# Altium schematic symbol library Electronic Devices_LIB.SchLib: 703 symbols (part 1 of 8) (continued)
## CAP_4.7UF_16V_X5R_0603 (continued)
CAP CER 4.7UF 16V X5R 0603; Manufacturer: Samsung; Material: Ceramic; Tolerance: 10%; Supplier 1: Digi-Key; Manufacturer Part Number: CL10A475KO8NNNC; RoHS: Yes; Category: Ceramic Capacitors; Stock 1: 1197540; Pricing 1: 1=0.12, 10=0.084, 50=0.0476, 100=0.0394, 500=0.02764, 1000=0.02288 (USD); Mount: Surface Mount; Case Code (Metric): 1608; Case Code (Imperial): 0603; Min Operating Temperature: -55°C; Max Operating Temperature: 85°C; Packaging: Tape and Reel; Voltage Rating: 16V; Dielectric: X5R; Series: CL; Construction: Flat; Length: 1.6mm; Height: 0.8mm; Depth: 0.8mm; Radiation Hardening: No; RoHS Compliant: Yes; ComponentLink1URL: https://datasheet.ciiva.com/25795/cl10a475ko8nnnc-25795890.pdf?src-supplier=Digi-Key; ComponentLink1Description: https://datasheet.ciiva.com/25795/cl10a475ko8nnnc-25795890.pdf?src-supplier=Digi-Key; ComponentLink2URL: https://datasheet.ciiva.com/26838/getdatasheetpartid-358619-26838383.pdf?src-supplier=Verical; ComponentLink2Description: https://datasheet.ciiva.com/26838/getdatasheetpartid-358619-26838383.pdf?src-supplier=Verical; ComponentLink3URL: https://datasheet.ciiva.com/29198/457663-da-01-en-vs-kondensator-0603-29198671.pdf?src-supplier=Conrad; ComponentLink3Description: https://datasheet.ciiva.com/29198/457663-da-01-en-vs-kondensator-0603-29198671.pdf?src-supplier=Conrad; Supplier Part Number 1: 1276-1784-1-ND
footprint CAP_0603_CAPC1608X08N (Chip Capacitor, 2-Leads, Body 1.60x0.80mm, IPC Medium Density)
pins: 1, 2

## CAP_4.7uF_16V_X7S_0603
designator C?, comment Capacitance: 4.7uF  Voltage Rating (DC): 16V  Case/Package: 0603  (hidden comment: GRM188C71C475KE21D)
Multilayer Ceramic Capacitor, 4.7 uF, 16 V, ± 10%, X7S, 0603 [1608 Metric]; Manufacturer: Murata; Material: 4241ConductorMaterial; Dielectric: 1542DielectricType; Supplier 1: Digikey; Manufacturer Part Number: GRM188C71C475KE21D; RoHS: Yes; Category: Ceramic Capacitors; Stock 1: 234182; Pricing 1: 1=0.27, 10=0.173, 50=0.1216, 100=0.0981, 500=0.07292, 1000=0.06381 (USD); Mount: Surface Mount; Min Operating Temperature: -55°C; Max Operating Temperature: 125°C; Series: GRM; Voltage Rating: 16V; Tolerance: 10%; Length: 1.6mm; Width: 800um; Height: 950um; Thickness: 800um; RoHS Compliant: Yes; ComponentLink1URL: http://search.murata.co.jp/Ceramy/image/img/A01X/G101/ENG/GRM188C71C475KE21-01.pdf?src-supplier=Digikey; ComponentLink1Description: http://search.murata.co.jp/Ceramy/image/img/A01X/G101/ENG/GRM188C71C475KE21-01.pdf?src-supplier=Digikey; Supplier Part Number 1: 490-16337-1-ND
footprint CAP_0603_CAPC1608X08N (Chip Capacitor, 2-Leads, Body 1.60x0.80mm, IPC Medium Density)
pins: 1, 2

## CAP_4.7uF_25V_X7R_0805
designator C?, comment Voltage Rating: 25V  Case/Package: 0805  Capacitance: 4.7uF  (hidden comment: CGA4J1X7R1E475M125AC)
Cap Ceramic 4.7uF 25V X7R 20% SMD 0805 125°C Blister Plastic T/R; Manufacturer: TDK; Supplier 1: Digikey; Manufacturer Part Number: CGA4J1X7R1E475M125AC; RoHS: Yes; Category: Ceramic Capacitors; Stock 1: 7894; Pricing 1: 1=0.43, 10=0.289, 50=0.2298, 100=0.1898, 500=0.14832, 1000=0.12607 (USD); Mount: Surface Mount; Case Code (Metric): 2012; Case Code (Imperial): 0805; Weight: 0.000194oz; Min Operating Temperature: -55°C; Max Operating Temperature: 125°C; Package Quantity: 2000; Packaging: Tape and Reel; Tolerance: 20%; Dielectric: X7R; Termination: SMD/SMT; Voltage Rating (DC): 25V; Series: CGA; Length: 2mm; Width: 1.25mm; Height: 1.25mm; Ratings: AEC-Q200; RoHS Compliant: Yes; ComponentLink1URL: https://product.tdk.com/info/en/documents/chara_sheet/CGA4J1X7R1E475M125AC.pdf?src-supplier=Digikey; ComponentLink1Description: https://product.tdk.com/info/en/documents/chara_sheet/CGA4J1X7R1E475M125AC.pdf?src-supplier=Digikey; ComponentLink2URL: http://product.tdk.com/en/catalog/datasheets/mlcc_automotive_general_en.pdf?src-supplier=Avnet; ComponentLink2Description: http://product.tdk.com/en/catalog/datasheets/mlcc_automotive_general_en.pdf?src-supplier=Avnet; ComponentLink3URL: http://product.tdk.com/capacitor/mlcc/detailed_information.php?lang=en&ref=jp&part_no=CGA4J1X7R1E475M125AC&src-supplier=Mouser; ComponentLink3Description: http://product.tdk.com/capacitor/mlcc/detailed_information.php?lang=en&ref=jp&part_no=CGA4J1X7R1E475M125AC&src-supplier=Mouser; ComponentLink4URL: https://datasheet.octopart.com/CGA4J1X7R1E475M125AC-TDK-datasheet-43366117.pdf?src-supplier=Future+Electronics; ComponentLink4Description: https://datasheet.octopart.com/CGA4J1X7R1E475M125AC-TDK-datasheet-43366117.pdf?src-supplier=Future+Electronics; ComponentLink5URL: https://datasheet.octopart.com/CGA4J1X7R1E475M125AC-TDK-datasheet-165583812.pdf?src-supplier=TME; ComponentLink5Description: https://datasheet.octopart.com/CGA4J1X7R1E475M125AC-TDK-datasheet-165583812.pdf?src-supplier=TME; Supplier Part Number 1: 445-12761-1-ND
footprint CAP_0805_CAPC2012X12N (Chip Capacitor, 2-Leads, Body 2.00x1.25mm, IPC Medium Density)
pins: 1, 2

## CAP_4.7uF_35V_X5R_1206
designator C?, comment Capacitance: 4.7uF  Voltage Rating: 35V  Case/Package: 1206  (hidden comment: CL31A475KL9LNNC)
Cap Ceramic 4.7uF 35V X5R 10% SMD 1206 85°C Cardboard T/R; Manufacturer: Samsung; Supplier 1: Mouser; Manufacturer Part Number: CL31A475KL9LNNC; RoHS: Yes; Category: Ceramic Capacitors; Stock 1: 1740; Pricing 1: 1=0.42, 10=0.227, 50=0.227, 100=0.147, 1000=0.125, 10000=0.099 (USD); Mount: Surface Mount; Case Code (Metric): 3216; Case Code (Imperial): 1206; Min Operating Temperature: -55°C; Max Operating Temperature: 85°C; Tolerance: 10%; Packaging: Tape and Reel; Dielectric: X5R; Series: CL; Construction: Flat; Length: 3.2mm; Height: 0.9mm; Depth: 1.6mm; Radiation Hardening: No; RoHS Compliant: Yes; ComponentLink1URL: https://datasheet.ciiva.com/25726/cl31a475kl9lnnc-25726083.pdf?src-supplier=Digi-Key; ComponentLink1Description: https://datasheet.ciiva.com/25726/cl31a475kl9lnnc-25726083.pdf?src-supplier=Digi-Key; ComponentLink2URL: https://datasheet.ciiva.com/15196/getdatasheetpartid-359588-15196005.pdf?src-supplier=Verical; ComponentLink2Description: https://datasheet.ciiva.com/15196/getdatasheetpartid-359588-15196005.pdf?src-supplier=Verical; Supplier Part Number 1: 187-CL31A475KL9LNNC
footprint CAP_1206_CAPC3216X16N (Chip Capacitor, 2-Leads, Body 3.20x1.60mm, IPC Medium Density)
pins: 1, 2

## CAP_4.7uF_50V_X7R_1210
designator C?, comment Capacitance: 4.7uF  Voltage Rating: 50V  Case Code (Imperial): 1210  (hidden comment: CC1210KKX7R9BB475)
Multilayer Ceramic Capacitor, 4.7 uF, 50 V, ± 10%, X7R, 1210 [3225 Metric]; Manufacturer: Yageo; Supplier 1: Digikey; Manufacturer Part Number: CC1210KKX7R9BB475; RoHS: Yes; Category: Ceramic Capacitors; Stock 1: 16965; Pricing 1: 1=0.44, 10=0.293, 50=0.2334, 100=0.1927 (USD); Mount: Surface Mount; Case/Package: 1210; Case Code (Metric): 3225; Weight: 0.000564oz; Min Operating Temperature: -55°C; Tolerance: 10%; Packaging: Tape and Reel; Dielectric: X7R; Voltage Rating (DC): 50V; Package Quantity: 500; Series: CC; Length: 0.126inch; Width: 0.098inch; Thickness: 0.11inch; Lead Free: Lead Free; Halogen Free: Halogen Free; RoHS Compliant: Yes; ComponentLink1URL: http://www.mouser.com/ds/2/447/Yageo_UPY-GP_NP0_16V-to-50V_9-358835.pdf?src-supplier=Mouser; ComponentLink1Description: http://www.mouser.com/ds/2/447/Yageo_UPY-GP_NP0_16V-to-50V_9-358835.pdf?src-supplier=Mouser; ComponentLink2URL: http://www.yageo.com/documents/recent/UPY-GPHC_X7R_6.3V-to-50V_18.pdf?src-supplier=Digikey; ComponentLink2Description: http://www.yageo.com/documents/recent/UPY-GPHC_X7R_6.3V-to-50V_18.pdf?src-supplier=Digikey; ComponentLink3URL: https://www.yageo.com/upload/media/product/productsearch/datasheet/mlcc/UPY-GPHC_X7R_6.3V-to-50V_18.pdf?src-supplier=Digikey; ComponentLink3Description: https://www.yageo.com/upload/media/product/productsearch/datasheet/mlcc/UPY-GPHC_X7R_6.3V-to-50V_18.pdf?src-supplier=Digikey; ComponentLink4URL: https://datasheet.octopart.com/CC1210KKX7R9BB475-Yageo-datasheet-151948686.pdf?src-supplier=Farnell; ComponentLink4Description: https://datasheet.octopart.com/CC1210KKX7R9BB475-Yageo-datasheet-151948686.pdf?src-supplier=Farnell; ComponentLink5URL: https://datasheet.octopart.com/CC1210KKX7R9BB475-Yageo-datasheet-137700084.pdf?src-supplier=Future+Electronics; ComponentLink5Description: https://datasheet.octopart.com/CC1210KKX7R9BB475-Yageo-datasheet-137700084.pdf?src-supplier=Future+Electronics; Supplier Part Number 1: 311-2037-1-ND; Max Operating Temperature: 125°C
footprint CAP_1210_CAPC3225X270N (0.126" L x 0.098" W (3.20mm x 2.50mm))
pins: 1, 2

## CAP_5.6pF_25V_NP0_0402
designator C?, comment 04023A5R6JAT2A  Capacitance: 5.6pF  Voltage Rating: 25V  Case/Package: 0402
Cap Ceramic 5.6pF 25V C0G 5% SMD 0402 125°C Paper T/R; Manufacturer: Kyocera AVX; Supplier 1: Mouser; Manufacturer Part Number: 04023A5R6JAT2A; RoHS: Yes; Category: Ceramic Capacitors; Stock 1: 3836; Pricing 1: 1=0.26, 10=0.173, 50=0.173, 100=0.098, 1000=0.061, 10000=0.047 (USD); Mount: Surface Mount; Number of Pins: 2; Case Code (Metric): 1005; Case Code (Imperial): 0402; Min Operating Temperature: -55°C; Max Operating Temperature: 125°C; Tolerance: 5%; Package Quantity: 10000; Packaging: Tape and Reel; Voltage Rating (DC): 25V; Dielectric: C0G; Termination: SMD/SMT; Series: -; Construction: Flat; Length: 1mm; Width: 0.02inch; Thickness: 0.022inch; Depth: 0.5mm; Radiation Hardening: No; RoHS Compliant: Yes; ComponentLink1URL: https://datasheet.ciiva.com/206/ccog-206404.pdf?src-supplier=Digi-Key; ComponentLink1Description: https://datasheet.ciiva.com/206/ccog-206404.pdf?src-supplier=Digi-Key; ComponentLink2URL: https://datasheet.ciiva.com/11570/ccog-11570453.pdf?src-supplier=Avnet; ComponentLink2Description: https://datasheet.ciiva.com/11570/ccog-11570453.pdf?src-supplier=Avnet; Supplier Part Number 1: 581-04023A5R6JAT2A
footprint CAP_0402_CAPC1005X05N (Chip Capacitor, 2-Leads, Body 1.00x0.50mm, IPC Medium Density)
pins: 1, 2

## CAP_5pF_50V_NP0_0603
designator C?, comment Voltage Rating: 50V  Capacitance: 5pF  Case/Package: 0603  (hidden comment: CL10C050CB81PNC)
Cap Cer 5PF 50V C0G/NP0 0603; Manufacturer: Samsung; Supplier 1: Digikey; Manufacturer Part Number: CL10C050CB81PNC; RoHS: Yes; Category: Ceramic Capacitors; Stock 1: 13452; Pricing 1: 1=0.1, 10=0.039, 50=0.0264, 100=0.0225, 500=0.01612, 1000=0.01413 (USD); Mount: Surface Mount; Case Code (Imperial): 0603; Case Code (Metric): 1608; Min Operating Temperature: -55°C; Max Operating Temperature: 125°C; Packaging: Cut Tape; Series: CL; Ratings: AEC-Q200; RoHS Compliant: Yes; ComponentLink1URL: http://www.samsungsem.com/kr/support/product-search/mlcc/CL10C050CB81PNC.jsp?src-supplier=Digikey; ComponentLink1Description: http://www.samsungsem.com/kr/support/product-search/mlcc/CL10C050CB81PNC.jsp?src-supplier=Digikey; Supplier Part Number 1: 1276-7005-1-ND
footprint CAP_0603_CAPC1608X08N (Chip Capacitor, 2-Leads, Body 1.60x0.80mm, IPC Medium Density)
pins: 1, 2

## CAP_6.8nF_50V_X7R_0603
designator C?, comment Voltage Rating: 50V  Capacitance: 6.8nF  Case/Package: 0603  (hidden comment: CL10B682JB8NNNC)
Multilayer Ceramic Capacitor, 6800 pF, 50 V, ± 5%, X7R, 0603 [1608 Metric]; Manufacturer: Samsung; Supplier 1: Digikey; Manufacturer Part Number: CL10B682JB8NNNC; RoHS: Yes; Category: Ceramic Capacitors; Stock 1: 170085; Pricing 1: 1=0.1, 10=0.019, 50=0.0108, 100=0.0083, 500=0.00626, 1000=0.00492 (USD); Mount: Surface Mount; Case Code (Metric): 1608; Case Code (Imperial): 0603; Material: Ceramic; Min Operating Temperature: -55°C; Max Operating Temperature: 125°C; Tolerance: 5%; Packaging: Tape and Reel; Package Quantity: 1; Dielectric: X7R; Voltage: 50V; Voltage Rating (DC): 50V; Series: CL; Construction: Flat; Length: 1.6mm; Width: 0.031inch; Height: 0.8mm; Thickness: 0.035inch; Depth: 0.8mm; Radiation Hardening: No; RoHS Compliant: Yes; ComponentLink1URL: https://datasheet.ciiva.com/25770/cl10b682jb8nnnc-25770152.pdf?src-supplier=Digikey; ComponentLink1Description: https://datasheet.ciiva.com/25770/cl10b682jb8nnnc-25770152.pdf?src-supplier=Digikey; ComponentLink2URL: https://datasheet.ciiva.com/26838/getdatasheetpartid-640154-26838477.pdf?src-supplier=Verical; ComponentLink2Description: https://datasheet.ciiva.com/26838/getdatasheetpartid-640154-26838477.pdf?src-supplier=Verical; Supplier Part Number 1: 1276-2099-1-ND
footprint CAP_0603_CAPC1608X08N (Chip Capacitor, 2-Leads, Body 1.60x0.80mm, IPC Medium Density)
pins: 1, 2

## CAP_6pF_50V_NP0_0402
designator C?, comment Capacitance: 6pF  Voltage Rating: 50V  Case/Package: 0402  (hidden comment: GRM1555C1H6R0DA01D)
Multilayer Ceramic Capacitor, 6 pF, 50 V, ± 0.5pF, C0G (NP0), 0402 [1005 Metric]; Manufacturer: Murata; Supplier 1: Digi-Key; Manufacturer Part Number: GRM1555C1H6R0DA01D; RoHS: Yes; Category: Ceramic Capacitors; Stock 1: 208302; Pricing 1: 1=0.1, 10=0.036, 50=0.0204, 100=0.0158, 500=0.0119, 1000=0.00935, 2500=0.0085, 5000=0.00782 (USD); Mount: Surface Mount; Case Code (Imperial): 0402; Case Code (Metric): 1005; Weight: 2.3E-05oz; Min Operating Temperature: -55°C; Max Operating Temperature: 125°C; Packaging: Tape and Reel; Package Quantity: 1; Voltage Rating (DC): 50V; Dielectric: C0G; Termination: SMD/SMT; Series: GRM; Construction: Flat; Length: 1mm; Width: 0.02inch; Height: 0.5mm; Thickness: 0.022inch; Depth: 0.5mm; Radiation Hardening: No; Lead Free: Lead Free; RoHS Compliant: Yes; ComponentLink1URL: https://datasheet.ciiva.com/16507/product-16507873.pdf?src-supplier=Future+Electronics; ComponentLink1Description: https://datasheet.ciiva.com/16507/product-16507873.pdf?src-supplier=Future+Electronics; ComponentLink2URL: https://datasheet.ciiva.com/6277/partnumbering-e-01-6277820.pdf?src-supplier=Digi-Key; ComponentLink2Description: https://datasheet.ciiva.com/6277/partnumbering-e-01-6277820.pdf?src-supplier=Digi-Key; ComponentLink3URL: https://datasheet.ciiva.com/6277/partnumbering-e-01-6277821.pdf?src-supplier=Digi-Key; ComponentLink3Description: https://datasheet.ciiva.com/6277/partnumbering-e-01-6277821.pdf?src-supplier=Digi-Key; ComponentLink4URL: https://datasheet.ciiva.com/6277/partnumbering-e-01-6277822.pdf?src-supplier=Digi-Key; ComponentLink4Description: https://datasheet.ciiva.com/6277/partnumbering-e-01-6277822.pdf?src-supplier=Digi-Key; Supplier Part Number 1: 490-5877-1-ND
footprint CAP_0402_CAPC1005X05N (Chip Capacitor, 2-Leads, Body 1.00x0.50mm, IPC Medium Density)
pins: 1, 2

## CAP_7PF_50V_NP0_0603
designator C?, comment Voltage Rating (DC): 50V  Capacitance: 7pF  Case/Package: 0603  (hidden comment: C1608C0G1H070D080AA)
C Series 0603 7 pF 50 V ±0.5 pF Tolerance C0G SMT Multilayer Ceramic Capacitor; Manufacturer: TDK; Supplier 1: Digi-Key; Manufacturer Part Number: C1608C0G1H070D080AA; RoHS: Yes; Category: Ceramic Capacitors; Stock 1: 64389; Pricing 1: 1=0.1, 10=0.073, 50=0.0414, 100=0.0343, 500=0.02402, 1000=0.01989 (USD); Mount: Surface Mount; Dielectric Material: Ceramic; Case Code (Metric): 1608; Case Code (Imperial): 0603; Weight: 7.1E-05oz; Min Operating Temperature: -55°C; Max Operating Temperature: 125°C; Construction: Flat; Packaging: Tape and Reel; Voltage Rating: 50V; Package Quantity: 4000; Dielectric: C0G; Termination: SMD/SMT; Series: C; Length: 1.6mm; Width: 0.8mm; Height: 0.8mm; Depth: 0.8mm; Lead Free: Lead Free; RoHS Compliant: Yes; Reach SVHC Compliant: No; ComponentLink1URL: https://datasheet.ciiva.com/24217/c1608c0g1h070d080aa-264569-24217366.pdf?src-supplier=Mouser; ComponentLink1Description: https://datasheet.ciiva.com/24217/c1608c0g1h070d080aa-264569-24217366.pdf?src-supplier=Mouser; ComponentLink2URL: https://datasheet.ciiva.com/16427/e413-c-16427733.pdf?src-supplier=Future+Electronics; ComponentLink2Description: https://datasheet.ciiva.com/16427/e413-c-16427733.pdf?src-supplier=Future+Electronics; ComponentLink3URL: https://datasheet.ciiva.com/6293/tdkmlcccaprange-6293212.pdf?src-supplier=Digi-Key; ComponentLink3Description: https://datasheet.ciiva.com/6293/tdkmlcccaprange-6293212.pdf?src-supplier=Digi-Key; ComponentLink4URL: https://datasheet.ciiva.com/6293/tdkmlcccaprange-6293215.pdf?src-supplier=Digi-Key; ComponentLink4Description: https://datasheet.ciiva.com/6293/tdkmlcccaprange-6293215.pdf?src-supplier=Digi-Key; Supplier Part Number 1: 445-5041-1-ND
footprint CAP_0603_CAPC1608X08N (Chip Capacitor, 2-Leads, Body 1.60x0.80mm, IPC Medium Density)
pins: 1, 2

## CAP_8pF_50V_NP0_0603
designator C?, comment GRM1885C1H8R0DA01D  Capacitance: 8pF  Voltage Rating: 50V  Case/Package: 0603
CAP CER 8PF 50V C0G/NP0 0603; Manufacturer: Murata; Material: Ceramic; Dielectric: C0G; Supplier 1: Digi-Key; Manufacturer Part Number: GRM1885C1H8R0DA01D; RoHS: Yes; Category: Ceramic Capacitors; Stock 1: 35490; Pricing 1: 1=0.11, 10=0.079, 50=0.045, 100=0.0372, 500=0.02608, 1000=0.0216 (USD); Mount: Surface Mount; Case Code (Metric): 1608; Min Operating Temperature: -55°C; Max Operating Temperature: 125°C; Package Quantity: 4000; Packaging: Tape and Reel; Voltage Rating (DC): 50V; Termination: SMD/SMT; Series: GRM; Length: 1.6mm; Width: 0.8mm; Height: 0.8mm; Thickness: 0.035inch; Lead Free: Lead Free; RoHS Compliant: Yes; ComponentLink1URL: https://datasheet.ciiva.com/29538/partnumbering-e-01-29538236.pdf?src-supplier=Digi-Key; ComponentLink1Description: https://datasheet.ciiva.com/29538/partnumbering-e-01-29538236.pdf?src-supplier=Digi-Key; ComponentLink2URL: https://datasheet.ciiva.com/41860/partnumbering-e-01-41860761.pdf?src-supplier=Digi-Key; ComponentLink2Description: https://datasheet.ciiva.com/41860/partnumbering-e-01-41860761.pdf?src-supplier=Digi-Key; Supplier Part Number 1: 490-9670-6-ND; Case Code (Imperial): 0603
footprint CAP_0603_CAPC1608X08N (Chip Capacitor, 2-Leads, Body 1.60x0.80mm, IPC Medium Density)
pins: 1, 2

## CAP_9PF_50V_NP0_0603
designator C?, comment Voltage Rating: 50V  Capacitance: 9pF  Case/Package: 0603  (hidden comment: GRM1885C1H9R0DA01D)
0603 9 pF 50 V ±0.5 pF Tolerance C0G/NP0 Multilayer Ceramic Capacitor; Manufacturer: Murata; Dielectric: C0G; Supplier 1: Digi-Key; Manufacturer Part Number: GRM1885C1H9R0DA01D; RoHS: Yes; Category: Ceramic Capacitors; Stock 1: 54353; Pricing 1: 1=0.11, 10=0.079, 50=0.045, 100=0.0372, 500=0.02608, 1000=0.0216 (USD); Mount: Surface Mount; Case Code (Metric): 1608; Case Code (Imperial): 0603; Min Operating Temperature: -55°C; Max Operating Temperature: 125°C; Voltage Rating (DC): 50V; Packaging: Tape and Reel; Package Quantity: 4000; Termination: SMD/SMT; Series: GRM; Length: 0.063inch; Width: 0.031inch; Height: 0.8mm; Thickness: 0.035inch; RoHS Compliant: Yes; ComponentLink1URL: https://datasheet.ciiva.com/29538/partnumbering-e-01-29538197.pdf?src-supplier=Digi-Key; ComponentLink1Description: https://datasheet.ciiva.com/29538/partnumbering-e-01-29538197.pdf?src-supplier=Digi-Key; Supplier Part Number 1: 490-11483-1-ND
footprint CAP_0603_CAPC1608X08N (Chip Capacitor, 2-Leads, Body 1.60x0.80mm, IPC Medium Density)
pins: 1, 2

## CAP_10nF_10V_X7R_0402
designator C?, comment Case Code (Imperial): 0402  Voltage Rating: 10V  Capacitance: 10nF  (hidden comment: C0402C103K8RACTU)
Ceramic Capacitor, Multilayer, Ceramic, 10V, 10% +Tol, 10% -Tol, X7R, 15% TC, 0.01uF, 0402; Manufacturer: KEMET; Dielectric Material: 4241ConductorMaterial; Dissipation Factor: 5%; Supplier 1: Digikey; Manufacturer Part Number: C0402C103K8RACTU; RoHS: Yes; Category: Ceramic Capacitors; Stock 1: 703450; Pricing 1: 1=0.1, 10=0.018, 50=0.0104, 100=0.008, 500=0.006, 1000=0.00472, 2500=0.00429, 5000=0.00395 (USD); Mount: Surface Mount; Case/Package: 0402; Number of Pins: 2NUMBER; Case Code (Metric): 1005; Material: 4241ConductorMaterial; Min Operating Temperature: -55°C; Max Operating Temperature: 125°C; Tolerance: 10%; Dielectric: X7R; Package Quantity: 10000; Packaging: Tape and Reel; Voltage Rating (DC): 10V; Termination: SMD/SMT; Series: SMD Comm X7R; Construction: Flat; Length: 1mm; Width: 0.5mm; Height: 0.5mm; Lead Pitch: 0.3mm; Thickness: 0.022inch; Depth: 0.5mm; Radiation Hardening: No; RoHS Compliant: Yes; Reach SVHC Compliant: No; ComponentLink1URL: http://www.jameco.com/Jameco/Products/ProdDS/2014182.pdf?src-supplier=Jameco; ComponentLink1Description: http://www.jameco.com/Jameco/Products/ProdDS/2014182.pdf?src-supplier=Jameco; ComponentLink2URL: http://www.farnell.com/datasheets/2746035.pdf?src-supplier=Farnell; ComponentLink2Description: http://www.farnell.com/datasheets/2746035.pdf?src-supplier=Farnell; ComponentLink3URL: http://components.arrow.com/part/dataview/3443725S6046007N7429?src-supplier=Arrow+Electronics; ComponentLink3Description: http://components.arrow.com/part/dataview/3443725S6046007N7429?src-supplier=Arrow+Electronics; ComponentLink4URL: http://www.mouser.com/ds/2/212/KEM_C1002_X7R_SMD-1102033.pdf?src-supplier=Mouser; ComponentLink4Description: http://www.mouser.com/ds/2/212/KEM_C1002_X7R_SMD-1102033.pdf?src-supplier=Mouser; ComponentLink5URL: http://www.farnell.com/datasheets/1828800.pdf?src-supplier=Newark; ComponentLink5Description: http://www.farnell.com/datasheets/1828800.pdf?src-supplier=Newark; ComponentLink6URL: https://api.kemet.com/component-edge/download/datasheet/C0402C103K8RACTU.pdf?src-supplier=Digikey; ComponentLink6Description: https://api.kemet.com/component-edge/download/datasheet/C0402C103K8RACTU.pdf?src-supplier=Digikey; ComponentLink7URL: http://www.farnell.com/datasheets/2746035.pdf?src-supplier=Element14; ComponentLink7Description: http://www.farnell.com/datasheets/2746035.pdf?src-supplier=Element14; ComponentLink8URL: http://capacitoredge.kemet.com/capedge2/DataSheet?pn=C0402C103K8RACTU&src-supplier=Avnet; ComponentLink8Description: http://capacitoredge.kemet.com/capedge2/DataSheet?pn=C0402C103K8RACTU&src-supplier=Avnet; ComponentLink9URL: https://www.verical.com/server-webapp/html/getDatasheet?partID=74963&src-supplier=Verical; ComponentLink9Description: https://www.verical.com/server-webapp/html/getDatasheet?partID=74963&src-supplier=Verical; ComponentLink10URL: http://www.farnell.com/datasheets/2746035.pdf?src-supplier=Newark; ComponentLink10Description: http://www.farnell.com/datasheets/2746035.pdf?src-supplier=Newark; ComponentLink11URL: https://datasheet.octopart.com/C0402C103K8RACTU-Kemet-datasheet-21527579.pdf?src-supplier=Newark; ComponentLink11Description: https://datasheet.octopart.com/C0402C103K8RACTU-Kemet-datasheet-21527579.pdf?src-supplier=Newark; ComponentLink12URL: https://datasheet.octopart.com/C0402C103K8RACTU-Kemet-datasheet-65850003.pdf?src-supplier=Element14; ComponentLink12Description: https://datasheet.octopart.com/C0402C103K8RACTU-Kemet-datasheet-65850003.pdf?src-supplier=Element14; ComponentLink13URL: https://datasheet.octopart.com/C0402C103K8RACTU-KEMET-datasheet-149521620.pdf?src-supplier=Farnell; ComponentLink13Description: https://datasheet.octopart.com/C0402C103K8RACTU-KEMET-datasheet-149521620.pdf?src-supplier=Farnell; ComponentLink14URL: https://datasheet.octopart.com/C0402C103K8RACTU-KEMET-datasheet-157246124.pdf?src-supplier=Electro+Sonic; ComponentLink14Description: https://datasheet.octopart.com/C0402C103K8RACTU-KEMET-datasheet-157246124.pdf?src-supplier=Electro+Sonic; ComponentLink15URL: https://datasheet.octopart.com/C0402C103K8RACTU-KEMET-datasheet-140424561.pdf?src-supplier=TME; ComponentLink15Description: https://datasheet.octopart.com/C0402C103K8RACTU-KEMET-datasheet-140424561.pdf?src-supplier=TME; Supplier Part Number 1: 399-C0402C103K8RAC7867CT-ND
footprint CAP_0402_CAPC1005X05N (Chip Capacitor, 2-Leads, Body 1.00x0.50mm, IPC Medium Density)
pins: 1, 2

## CAP_10nF_50V_X7R_0402
designator C?, comment Voltage Rating: 50V  Capacitance: 10nF  Case/Package: 0402  (hidden comment: GRM155R71H103KA88D)
Multilayer Ceramic Capacitors MLCC Surface Mount 0402 0.01uF 50 Volts X7R 10%; Manufacturer: Murata; Voltage: 25V; Supplier 1: Digikey; Manufacturer Part Number: GRM155R71H103KA88D; RoHS: Yes; Category: Ceramic Capacitors; Stock 1: 5190059; Pricing 1: 1=0.1, 10=0.023, 50=0.013, 100=0.0101, 500=0.0076, 1000=0.00598, 2500=0.00543, 5000=0.005 (USD); Mount: Surface Mount; Number of Pins: 2; Case Code (Metric): 1005; Case Code (Imperial): 0402; Material: Ceramic; Min Operating Temperature: -55°C; Max Operating Temperature: 125°C; Tolerance: 10%; Packaging: Tape and Reel; Package Quantity: 1; Dielectric: X7R; Termination: SMD/SMT; Series: GRM; Construction: Flat; Voltage Rating (DC): 50V; Length: 1mm; Width: 0.02inch; Height: 0.5mm; Thickness: 0.022inch; Depth: 0.5mm; Radiation Hardening: No; Reach SVHC Compliant: No; RoHS Compliant: Yes; Lead Free: 5697LeadFree; ComponentLink1URL: https://datasheet.ciiva.com/22698/1747449-22698420.pdf?src-supplier=Element14; ComponentLink1Description: https://datasheet.ciiva.com/22698/1747449-22698420.pdf?src-supplier=Element14; ComponentLink2URL: https://datasheet.ciiva.com/19476/1856433-19476546.pdf?src-supplier=Jameco; ComponentLink2Description: https://datasheet.ciiva.com/19476/1856433-19476546.pdf?src-supplier=Jameco; ComponentLink3URL: https://datasheet.ciiva.com/129/product-129810.pdf?src-supplier=Digikey; ComponentLink3Description: https://datasheet.ciiva.com/129/product-129810.pdf?src-supplier=Digikey; ComponentLink4URL: https://datasheet.ciiva.com/11786/0900766b80ef921d-11786340.pdf?src-supplier=Rs; ComponentLink4Description: https://datasheet.ciiva.com/11786/0900766b80ef921d-11786340.pdf?src-supplier=Rs; ComponentLink5URL: https://datasheet.ciiva.com/18100/getdatasheetpartid-27434-18100660.pdf?src-supplier=Verical; ComponentLink5Description: https://datasheet.ciiva.com/18100/getdatasheetpartid-27434-18100660.pdf?src-supplier=Verical; ComponentLink6URL: https://datasheet.ciiva.com/29199/454225-da-01-en-vs-kondensator-0402-29199740.pdf?src-supplier=Conrad; ComponentLink6Description: https://datasheet.ciiva.com/29199/454225-da-01-en-vs-kondensator-0402-29199740.pdf?src-supplier=Conrad; ComponentLink7URL: https://datasheet.ciiva.com/129/grm155r71h103ka88-01-129811.pdf?src-supplier=Digikey; ComponentLink7Description: https://datasheet.ciiva.com/129/grm155r71h103ka88-01-129811.pdf?src-supplier=Digikey; ComponentLink8URL: https://datasheet.ciiva.com/129/grm155r71h103ka88-01-129812.pdf?src-supplier=Digikey; ComponentLink8Description: https://datasheet.ciiva.com/129/grm155r71h103ka88-01-129812.pdf?src-supplier=Digikey; ComponentLink9URL: https://datasheet.ciiva.com/5410/product-5410990.pdf?src-supplier=Mouser; ComponentLink9Description: https://datasheet.ciiva.com/5410/product-5410990.pdf?src-supplier=Mouser; ComponentLink10URL: https://datasheet.ciiva.com/16495/product-16495290.pdf?src-supplier=Future+Electronics; ComponentLink10Description: https://datasheet.ciiva.com/16495/product-16495290.pdf?src-supplier=Future+Electronics; Supplier Part Number 1: 490-4516-6-ND
footprint CAP_0402_CAPC1005X05N (Chip Capacitor, 2-Leads, Body 1.00x0.50mm, IPC Medium Density)
pins: 1, 2

## CAP_10PF_16V_NP0_0603
designator C?, comment Voltage Rating: 16V  Capacitance: 10pF  Case/Package: 0603  (hidden comment: 885012006017)
Cap, 10PF, 16V, 5%, C0G/NP0, 0603; Manufacturer: Wurth Electronics; Manufacturer Part Number: 885012006017; RoHS: Yes; Category: Ceramic Capacitors; Stock 1: 29058; Pricing 1: 1=0.10000, 10=0.02700, 100=0.02400, 500=0.02100 (USD); Mount: Surface Mount; Case Code (Metric): 1608; Case Code (Imperial): 0603; Min Operating Temperature: -55°C; Max Operating Temperature: 125°C; Packaging: Tape and Reel; Tolerance: 5%; Length: 0.063inch; Width: 0.031inch; Thickness: 0.034inch; RoHS Compliant: Yes; ComponentLink1URL: http://www.farnell.com/datasheets/2546581.pdf?src-supplier=Farnell; ComponentLink1Description: http://www.farnell.com/datasheets/2546581.pdf?src-supplier=Farnell; ComponentLink2URL: http://www.farnell.com/datasheets/2546581.pdf?src-supplier=Element14; ComponentLink2Description: http://www.farnell.com/datasheets/2546581.pdf?src-supplier=Element14; ComponentLink3URL: http://www.farnell.com/datasheets/2546581.pdf?src-supplier=Newark; ComponentLink3Description: http://www.farnell.com/datasheets/2546581.pdf?src-supplier=Newark; ComponentLink4URL: https://katalog.we-online.de/pbs/datasheet/885012006017.pdf?src-supplier=Digi-Key; ComponentLink4Description: https://katalog.we-online.de/pbs/datasheet/885012006017.pdf?src-supplier=Digi-Key; Supplier 1: Digi-Key; Supplier 2: Newark; Supplier 3: Mouser; Supplier Part Number 1: 732-7760-6-ND; Supplier Part Number 2: 45AC8291; Supplier Part Number 3: 710-885012006017
footprint CAP_0603_CAPC1608X08N (Chip Capacitor, 2-Leads, Body 1.60x0.80mm, IPC Medium Density)
pins: 1, 2

## CAP_10PF_50V_NP0_0402
designator C?, comment Case/Package: 0402  Voltage Rating: 50V  Capacitance: 10pF  (hidden comment: GJM1555C1H100FB01D)
Multilayer Ceramic Capacitor, 10 pF, 50 V, ± 1%, C0G (NP0), 0402 [1005 Metric]; Manufacturer: Murata; Material: 4241ConductorMaterial; Temperature Coefficient: 30ppm/°C; Supplier 1: Digikey; Manufacturer Part Number: GJM1555C1H100FB01D; RoHS: Yes; Category: Ceramic Capacitors; Stock 1: 104534; Pricing 1: 1=0.17, 10=0.113, 50=0.0676, 100=0.0532, 500=0.03926, 1000=0.03251, 2500=0.03026, 5000=0.02768 (USD); Mount: Surface Mount; Case Code (Imperial): 0402; Case Code (Metric): 1005; Weight: 2.3E-05oz; Min Operating Temperature: -55°C; Max Operating Temperature: 125°C; Packaging: Tape and Reel; Tolerance: 1%; Voltage Rating (DC): 50V; Dielectric: C0G; Termination: SMD/SMT; Voltage: 50V; Series: GJM; Construction: Flat; Length: 1mm; Width: 0.02inch; Height: 0.5mm; Thickness: 0.022inch; Depth: 0.5mm; Radiation Hardening: No; Reach SVHC Compliant: No; Lead Free: Lead Free; RoHS Compliant: Yes; ComponentLink1URL: https://datasheet.ciiva.com/11607/c02e-11607390.pdf?src-supplier=Avnet; ComponentLink1Description: https://datasheet.ciiva.com/11607/c02e-11607390.pdf?src-supplier=Avnet; Supplier Part Number 1: 490-11189-1-ND
footprint CAP_0402_CAPC1005X05N (Chip Capacitor, 2-Leads, Body 1.00x0.50mm, IPC Medium Density)
pins: 1, 2

## CAP_10UF_6.3V_X5R_0402
designator C?, comment Case/Package: 0402  Capacitance: 10uF  Voltage Rating: 6.3V  (hidden comment: CL05A106MQ5NUNC)
Cap Ceramic 10uF 6.3V X5R 20% SMD 0402 85C T/R; Manufacturer: Samsung; Supplier 1: Digikey; Manufacturer Part Number: CL05A106MQ5NUNC; RoHS: Yes; Category: Ceramic Capacitors; Stock 1: 6097180; Pricing 1: 1=0.24, 10=0.153, 50=0.0968, 100=0.0774, 500=0.05588, 1000=0.04943, 2500=0.04728, 5000=0.04299 (USD); Mount: Surface Mount; Case Code (Metric): 1005; Case Code (Imperial): 0402; Min Operating Temperature: -55°C; Max Operating Temperature: 85°C; Packaging: Tape and Reel; Tolerance: 20%; Dielectric: X5R; Series: CL; Package Quantity: 1; Construction: Flat; Length: 1mm; Width: 0.02inch; Height: 0.5mm; Depth: 0.5mm; Thickness: 0.028inch; Radiation Hardening: No; RoHS Compliant: Yes; ComponentLink1URL: https://datasheet.ciiva.com/16437/cl05a106mq5nunc-16437356.pdf?src-supplier=Future+Electronics; ComponentLink1Description: https://datasheet.ciiva.com/16437/cl05a106mq5nunc-16437356.pdf?src-supplier=Future+Electronics; ComponentLink2URL: https://datasheet.ciiva.com/26877/getdatasheetpartid-355289-26877841.pdf?src-supplier=Verical; ComponentLink2Description: https://datasheet.ciiva.com/26877/getdatasheetpartid-355289-26877841.pdf?src-supplier=Verical; Supplier Part Number 1: 1276-1451-1-ND
footprint CAP_0402_CAPC1005X05N (Chip Capacitor, 2-Leads, Body 1.00x0.50mm, IPC Medium Density)
pins: 1, 2

## CAP_10uF_6V_TANT
designator C?, comment Voltage: 6V  Capacitance: 10uF  (hidden comment: T498B106K006ATE2K1)
Capacitor, 10uF, 6VDC, 10-% Tol, 10+% Tol RoHS Compliant: Yes; Manufacturer: KEMET; Supplier 1: Digikey; Manufacturer Part Number: T498B106K006ATE2K1; RoHS: Yes; Category: Tantalum Capacitors; Stock 1: 1481; Pricing 1: 1=0.63, 10=0.442, 50=0.3724, 100=0.3033, 500=0.25274, 1000=0.21283, 2000=0.19953, 4000=0.18623, 10000=0.17957, 14000=0.17691, 50000=0.1696 (USD); RoHS Compliant: Yes; ComponentLink1URL: https://api.kemet.com/component-edge/download/datasheet/T498B106K006ATE2K1.pdf?src-supplier=Digikey; ComponentLink1Description: https://api.kemet.com/component-edge/download/datasheet/T498B106K006ATE2K1.pdf?src-supplier=Digikey; Supplier Part Number 1: 399-T498B106K006ATE2K1CT-ND
footprint CAP_TANT_T498B
pins: 1 +, 2 -

## CAP_10uF_10V_X5R_0603
designator C?, comment Voltage Rating: 10V  Capacitance: 10uF  Case/Package: 0603  (hidden comment: GRM188R61A106MAALD)
Multilayer Ceramic Capacitor, 10 uF, 10 V, ± 20%, X5R, 0603 [1608 Metric]; Manufacturer: Murata; Supplier 1: Digikey; Manufacturer Part Number: GRM188R61A106MAALD; RoHS: Yes; Category: Ceramic Capacitors; Stock 1: 173106; Pricing 1: 1=0.23, 10=0.149, 50=0.1042, 100=0.0842, 500=0.06254, 1000=0.05472 (USD); Mount: Surface Mount; Case Code (Metric): 1608; Case Code (Imperial): 0603; Weight: 0.000222oz; Material: Ceramic; Min Operating Temperature: -55°C; Max Operating Temperature: 85°C; Packaging: Tape and Reel; Tolerance: 20%; Dielectric: X5R; Termination: SMD/SMT; Voltage Rating (DC): 10V; Package Quantity: 4000; Series: GRM; Length: 0.063inch; Width: 0.031inch; Height: 0.8mm; Thickness: 0.037inch; RoHS Compliant: Yes; ComponentLink1URL: http://www.mouser.com/ds/2/281/c02e-2905.pdf?src-supplier=Mouser; ComponentLink1Description: http://www.mouser.com/ds/2/281/c02e-2905.pdf?src-supplier=Mouser; ComponentLink2URL: https://search.murata.co.jp/Ceramy/image/img/A01X/G101/ENG/GRM188R61A106MAAL-01.pdf?src-supplier=Digikey; ComponentLink2Description: https://search.murata.co.jp/Ceramy/image/img/A01X/G101/ENG/GRM188R61A106MAAL-01.pdf?src-supplier=Digikey; ComponentLink3URL: http://search.murata.co.jp/Ceramy/image/img/A01X/G101/ENG/GRM188R61A106MAAL-01.pdf?src-supplier=Digikey; ComponentLink3Description: http://search.murata.co.jp/Ceramy/image/img/A01X/G101/ENG/GRM188R61A106MAAL-01.pdf?src-supplier=Digikey; ComponentLink4URL: http://search.murata.co.jp/Ceramy/image/img/A01X/partnumbering_e_01.pdf?src-supplier=Digikey; ComponentLink4Description: http://search.murata.co.jp/Ceramy/image/img/A01X/partnumbering_e_01.pdf?src-supplier=Digikey; ComponentLink5URL: http://psearch.en.murata.com/capacitor/product/GRM188R61A106MAAL%23.pdf?src-supplier=Avnet; ComponentLink5Description: http://psearch.en.murata.com/capacitor/product/GRM188R61A106MAAL%23.pdf?src-supplier=Avnet; ComponentLink6URL: https://datasheet.octopart.com/GRM188R61A106MAALD-Murata-datasheet-149523207.pdf?src-supplier=Newark; ComponentLink6Description: https://datasheet.octopart.com/GRM188R61A106MAALD-Murata-datasheet-149523207.pdf?src-supplier=Newark; ComponentLink7URL: https://datasheet.octopart.com/GRM188R61A106MAALD-Murata-datasheet-165579666.pdf?src-supplier=TME; ComponentLink7Description: https://datasheet.octopart.com/GRM188R61A106MAALD-Murata-datasheet-165579666.pdf?src-supplier=TME; ComponentLink8URL: https://datasheet.octopart.com/GRM188R61A106MAALD-Murata-datasheet-150009163.pdf?src-supplier=Arrow.cn; ComponentLink8Description: https://datasheet.octopart.com/GRM188R61A106MAALD-Murata-datasheet-150009163.pdf?src-supplier=Arrow.cn; Supplier Part Number 1: 490-12734-6-ND
footprint CAP_0603_CAPC1608X08N (Chip Capacitor, 2-Leads, Body 1.60x0.80mm, IPC Medium Density)
pins: 1, 2

## CAP_10uF_16V_TANT
designator C?, comment Voltage: 16V  Capacitance: 10uF  (hidden comment: T498B106K006ATE2K1)
Capacitor, 10uF, 6VDC, 10-% Tol, 10+% Tol RoHS Compliant: Yes; Manufacturer: KEMET; Supplier 1: Digikey; Manufacturer Part Number: T498B106K006ATE2K1; RoHS: Yes; Category: Tantalum Capacitors; Stock 1: 1481; Pricing 1: 1=0.63, 10=0.442, 50=0.3724, 100=0.3033, 500=0.25274, 1000=0.21283, 2000=0.19953, 4000=0.18623, 10000=0.17957, 14000=0.17691, 50000=0.1696 (USD); RoHS Compliant: Yes; ComponentLink1URL: https://api.kemet.com/component-edge/download/datasheet/T498B106K006ATE2K1.pdf?src-supplier=Digikey; ComponentLink1Description: https://api.kemet.com/component-edge/download/datasheet/T498B106K006ATE2K1.pdf?src-supplier=Digikey; Supplier Part Number 1: 399-T498B106K006ATE2K1CT-ND
footprint CAP_TANT_T491C
pins: 1 +, 2 -

## CAP_10UF_16V_X5R_0603
designator C?, comment Voltage Rating: 16V  Capacitance: 10uF  Case/Package: 0603  (hidden comment: GRM188R61C106MAALD)
0603 10 uF 16 V ±20% Tolerance X5R Multilayer Ceramic Chip Capacitor; Manufacturer: Murata; Manufacturer Part Number: GRM188R61C106MAALD; RoHS: Yes; Category: Ceramic Capacitors; Stock 1: 566627; Pricing 1: 1=0.24000, 10=0.16500, 50=0.11000, 100=0.09340, 500=0.06596, 1000=0.05771 (USD); Mount: Surface Mount; Case Code (Metric): 1608; Material: Ceramic; Case Code (Imperial): 0603; Min Operating Temperature: -55°C; Max Operating Temperature: 85°C; Tolerance: 20%; Packaging: Cut Tape; Voltage Rating (DC): 16V; Length: 0.063inch; Width: 0.031inch; Height: 0.8mm; Thickness: 0.037inch; Lead Free: Lead Free; RoHS Compliant: Yes; ComponentLink1URL: http://search.murata.co.jp/Ceramy/image/img/A01X/G101/ENG/GRM188R61C106MAAL-01.pdf?src-supplier=Digi-Key; ComponentLink1Description: http://search.murata.co.jp/Ceramy/image/img/A01X/G101/ENG/GRM188R61C106MAAL-01.pdf?src-supplier=Digi-Key; ComponentLink2URL: https://search.murata.co.jp/Ceramy/image/img/A01X/G101/ENG/GRM188R61C106MAAL-01.pdf?src-supplier=Digi-Key; ComponentLink2Description: https://search.murata.co.jp/Ceramy/image/img/A01X/G101/ENG/GRM188R61C106MAAL-01.pdf?src-supplier=Digi-Key; ComponentLink3URL: http://search.murata.co.jp/Ceramy/image/img/A01X/partnumbering_e_01.pdf?src-supplier=Digi-Key; ComponentLink3Description: http://search.murata.co.jp/Ceramy/image/img/A01X/partnumbering_e_01.pdf?src-supplier=Digi-Key; Supplier 1: Digi-Key; Supplier 2: Verical; Supplier 3: Mouser; Supplier Part Number 1: 490-10729-1-ND; Supplier Part Number 2: GRM188R61C106MAALD; Supplier Part Number 3: 81-GRM188R61C106MALD
footprint CAP_0603_CAPC1608X08N (Chip Capacitor, 2-Leads, Body 1.60x0.80mm, IPC Medium Density)
pins: 1, 2

## CAP_10uF_16V_X7R_0805
designator C?, comment Capacitance: 10uF  Voltage Rating: 16V  Case/Package: 0805  (hidden comment: CL21B106KOQNNNE)
Multilayer Ceramic Capacitor, 10 uF, 16 V, ï¿½ 10%, X7R, 0805 [2012 Metric]; Manufacturer: Samsung; Supplier 1: Digikey; Manufacturer Part Number: CL21B106KOQNNNE; RoHS: Yes; Category: Ceramic Capacitors; Stock 1: 1338276; Pricing 1: 1=0.26, 10=0.167, 50=0.1052, 100=0.0841, 500=0.06076, 1000=0.05375, 2000=0.05142, 4000=0.04674, 10000=0.04441, 14000=0.04207, 50000=0.03739, 100000=0.03155, 200000=0.03108 (USD); Mount: Surface Mount; Case Code (Metric): 2012; Case Code (Imperial): 0805; Material: Ceramic; Min Operating Temperature: -55°C; Max Operating Temperature: 125°C; Packaging: Tape and Reel; Package Quantity: 1; Series: CL; Tolerance: 10%; Dielectric: X7R; Voltage: 16V; Construction: Flat; Voltage Rating (DC): 16V; Length: 2mm; Width: 0.049inch; Height: 1.25mm; Depth: 1.25mm; Thickness: 0.055inch; Radiation Hardening: No; RoHS Compliant: Yes; ComponentLink1URL: https://datasheet.ciiva.com/25794/cl21b106koqnnne-25794472.pdf?src-supplier=Digikey; ComponentLink1Description: https://datasheet.ciiva.com/25794/cl21b106koqnnne-25794472.pdf?src-supplier=Digikey; ComponentLink2URL: https://datasheet.ciiva.com/16428/cl21b106koqnnne-16428887.pdf?src-supplier=Future+Electronics; ComponentLink2Description: https://datasheet.ciiva.com/16428/cl21b106koqnnne-16428887.pdf?src-supplier=Future+Electronics; ComponentLink3URL: https://datasheet.ciiva.com/26920/getdatasheetpartid-355170-26920201.pdf?src-supplier=Verical; ComponentLink3Description: https://datasheet.ciiva.com/26920/getdatasheetpartid-355170-26920201.pdf?src-supplier=Verical; Supplier Part Number 1: 1276-2872-1-ND
footprint CAP_0805_CAPC2012X12N (Chip Capacitor, 2-Leads, Body 2.00x1.25mm, IPC Medium Density)
pins: 1, 2

## CAP_10UF_25V_X5R_0603
designator C?, comment Case/Package: 0603  Capacitance: 10uF  Voltage Rating: 25V  (hidden comment: GRM188R61E106MA73D)
Multilayer Ceramic Capacitor, 10 uF, 25 V, ± 20%, X5R, 0603 [1608 Metric]; Manufacturer: Murata; Material: 4241ConductorMaterial; Supplier 1: Digi-Key; Manufacturer Part Number: GRM188R61E106MA73D; RoHS: Yes; Category: Ceramic Capacitors; Stock 1: 2712970; Pricing 1: 1=0.26, 10=0.168, 50=0.1176, 100=0.0949, 500=0.07054, 1000=0.06173 (USD); Mount: Surface Mount; Number of Pins: 2; Case Code (Imperial): 0603; Weight: 0.000222oz; Min Operating Temperature: -55°C; Max Operating Temperature: 85°C; Tolerance: 20%; Packaging: Cut Tape; Package Quantity: 1; Dielectric: X5R; Voltage: 25V; Termination: SMD/SMT; Voltage Rating (DC): 25V; Series: GRM; Construction: Flat; Length: 1.6mm; Width: 0.031inch; Height: 0.8mm; Thickness: 0.031inch; Depth: 0.8mm; Reach SVHC Compliant: No; Lead Free: Lead Free; RoHS Compliant: Yes; ComponentLink1URL: https://datasheet.ciiva.com/22776/c02e-22776427.pdf?src-supplier=Farnell; ComponentLink1Description: https://datasheet.ciiva.com/22776/c02e-22776427.pdf?src-supplier=Farnell; ComponentLink2URL: https://datasheet.ciiva.com/22619/c02e-22619674.pdf?src-supplier=Element14; ComponentLink2Description: https://datasheet.ciiva.com/22619/c02e-22619674.pdf?src-supplier=Element14; ComponentLink3URL: https://datasheet.ciiva.com/22776/608985-22776426.pdf?src-supplier=Farnell; ComponentLink3Description: https://datasheet.ciiva.com/22776/608985-22776426.pdf?src-supplier=Farnell; ComponentLink4URL: https://datasheet.ciiva.com/14906/partnumbering-e-01-14906431.pdf?src-supplier=Digi-Key; ComponentLink4Description: https://datasheet.ciiva.com/14906/partnumbering-e-01-14906431.pdf?src-supplier=Digi-Key; ComponentLink5URL: https://datasheet.ciiva.com/14906/partnumbering-e-01-14906429.pdf?src-supplier=Digi-Key; ComponentLink5Description: https://datasheet.ciiva.com/14906/partnumbering-e-01-14906429.pdf?src-supplier=Digi-Key; Supplier Part Number 1: 490-7202-1-ND; Case Code (Metric): 1608
footprint CAP_0603_CAPC1608X08N (Chip Capacitor, 2-Leads, Body 1.60x0.80mm, IPC Medium Density)
pins: 1, 2

## CAP_10UF_25V_X5R_0805
designator C?, comment Voltage Rating: 25V  Capacitance: 10uF  Case/Package: 0805  (hidden comment: CL21A106KAYNNNE)
CAP CER 10UF 25V X5R 0805; Manufacturer: Samsung; Tolerance: 10%; Manufacturer Part Number: CL21A106KAYNNNE; RoHS: Yes; Category: Ceramic Capacitors; Stock 1: 1531231; Pricing 1: 1=0.18000, 10=0.12800, 50=0.07280, 100=0.06030, 500=0.04230, 1000=0.03501 (USD); Mount: Surface Mount; Case Code (Metric): 2012; Case Code (Imperial): 0805; Min Operating Temperature: -55°C; Max Operating Temperature: 85°C; Package Quantity: 1; Packaging: Tape and Reel; Dielectric: X5R; Series: CL; Construction: Flat; Length: 2mm; Width: 0.049inch; Height: 1.25mm; Depth: 1.25mm; Thickness: 0.057inch; Radiation Hardening: No; RoHS Compliant: Yes; ComponentLink1URL: https://datasheet.ciiva.com/25796/cl21a106kaynnne-25796720.pdf?src-supplier=Digi-Key; ComponentLink1Description: https://datasheet.ciiva.com/25796/cl21a106kaynnne-25796720.pdf?src-supplier=Digi-Key; ComponentLink2URL: https://datasheet.ciiva.com/26838/getdatasheetpartid-357558-26838583.pdf?src-supplier=Verical; ComponentLink2Description: https://datasheet.ciiva.com/26838/getdatasheetpartid-357558-26838583.pdf?src-supplier=Verical; Supplier 1: Digi-Key; Supplier 2: Newark; Supplier 3: Mouser; Supplier Part Number 1: 1276-2891-6-ND; Supplier Part Number 2: 82AC9388; Supplier Part Number 3: 187-CL21A106KAYNNNE
footprint CAP_0805_CAPC2012X12N (Chip Capacitor, 2-Leads, Body 2.00x1.25mm, IPC Medium Density)
pins: 1, 2

## CAP_10uF_35V_X5R_1206
designator C?, comment Voltage Rating: 35V  Capacitance: 10uF  Case/Package: 1206  (hidden comment: GRM319R6YA106KA12D)
1206 10 uF 35 V ±10 % Tolerance X5R SMT Multilayer Ceramic Capacitor; Manufacturer: Murata; Tolerance: 10%; Supplier 1: Mouser; Manufacturer Part Number: GRM319R6YA106KA12D; RoHS: Yes; Category: Ceramic Capacitors; Stock 1: 129741; Pricing 1: 1=0.3, 10=0.169, 50=0.169, 100=0.109, 1000=0.082, 10000=0.066 (USD); Mount: Surface Mount; Case Code (Metric): 3216; Case Code (Imperial): 1206; Weight: 0.001411oz; Min Operating Temperature: -55°C; Max Operating Temperature: 85°C; Packaging: Tape and Reel; Dielectric: X5R; Termination: Standard; Voltage Rating (DC): 35V; Package Quantity: 40000; Series: GRM; Length: 3.2mm; Width: 1.6mm; Height: 0.85mm; RoHS Compliant: Yes; ComponentLink1URL: http://www.farnell.com/datasheets/2079193.pdf?src-supplier=Farnell; ComponentLink1Description: http://www.farnell.com/datasheets/2079193.pdf?src-supplier=Farnell; ComponentLink2URL: http://www.mouser.com/ds/2/281/c02e-2905.pdf?src-supplier=Mouser; ComponentLink2Description: http://www.mouser.com/ds/2/281/c02e-2905.pdf?src-supplier=Mouser; ComponentLink3URL: http://search.murata.co.jp/Ceramy/image/img/A01X/G101/ENG/GRM319R6YA106KA12-01.pdf?src-supplier=Digi-Key; ComponentLink3Description: http://search.murata.co.jp/Ceramy/image/img/A01X/G101/ENG/GRM319R6YA106KA12-01.pdf?src-supplier=Digi-Key; ComponentLink4URL: http://www.farnell.com/datasheets/2079193.pdf?src-supplier=Element14; ComponentLink4Description: http://www.farnell.com/datasheets/2079193.pdf?src-supplier=Element14; ComponentLink5URL: https://datasheet.octopart.com/GRM319R6YA106KA12D-Murata-datasheet-136617269.pdf?src-supplier=TME; ComponentLink5Description: https://datasheet.octopart.com/GRM319R6YA106KA12D-Murata-datasheet-136617269.pdf?src-supplier=TME; Supplier Part Number 1: 81-GRM319R6YA106KA2D
footprint CAP_1206_CAPC3216X16N (Chip Capacitor, 2-Leads, Body 3.20x1.60mm, IPC Medium Density)
pins: 1, 2
